# Altium footprint library MH_DA_THU_VIEN_16122016.PcbLib: 531 footprints (part 27 of 34)
Each footprint in its own frame and in the unit in brackets; x right, y up, seen from the top. Pads: shape width x height; smd on the part's side, far side on the other; paste and mask are expansions set on the pad; w line width, h text height; cw(c..) or ccw(c..) is an arc to the next point about the centre after c.
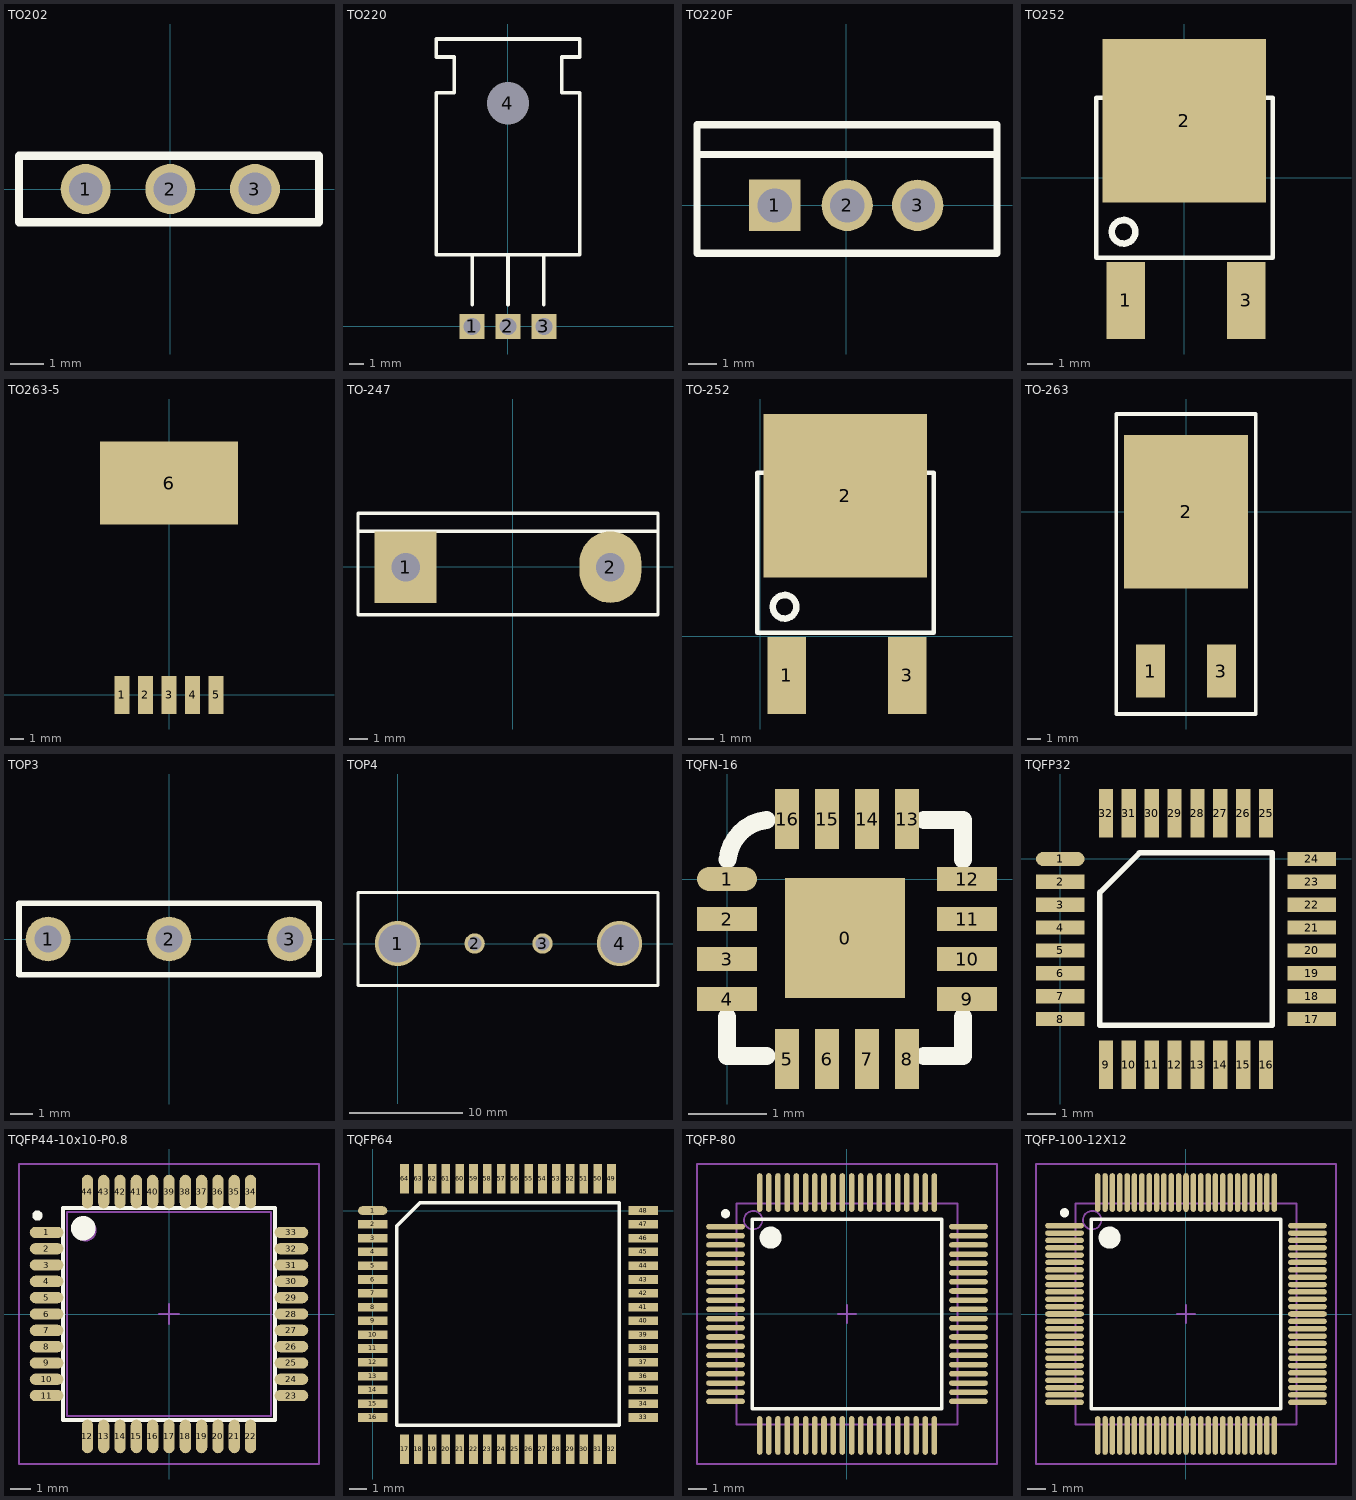
[diagram p26: the footprints below, top view; thin cyan lines are the x and y axes]

## TO202 [mm]
pads (3):
  round 1.5 hole 1: 1(-2.54,0) 2(0,0) 3(2.54,0)
Top Overlay:
  lines w0.254: -4.54,-1 -4.54,1 -3.54,1 3.46,1 4.46,1 4.46,-1 -3.54,-1 -4.54,-1

## TO220 [mil]
pads (4):
  rect 70x70 hole 47.24 unplated: 1(-100,0) 2(0,0) 3(100,0)
  round 70 hole 118.11 unplated: 4(0,621.26)
Top Overlay:
  lines w10: -100,60 -100,200 ; 0,60 0,200 ; 100,60 100,200 ; -200,200 -200,650 -150,650 -150,750 -200,750 -200,800 200,800 200,750 150,750 150,650 200,650 200,200 -200,200
3D body: height 762.4, standoff -532.48, extent -211.81,-39.37 188.19,126.19

## TO220F [mm]
pads (3):
  rect 1.8x1.8 hole 1.2: 1(-2.502,0)
  round 1.8 hole 1.2: 2(0.038,0) 3(2.502,0)
Top Overlay:
  lines w0.254: -5.22,1.778 5.279,1.778 5.279,1.753 ; -5.221,-1.676 -5.221,2.824 5.279,2.824 5.279,-1.676 -5.221,-1.676
3D body: height 19.37, standoff -9.48, extent -5.058,-1.88 5.083,2.82

## TO252 [mil]
pads (3):
  rect 59.06x118.11 smd: 1(-90,-188) 3(95,-188)
  rect 250x250 smd: 2(0,87)
Top Overlay:
  circle w10: c-93.03,-83 r18.03
  lines w7: -135,-123 -135,122 135,122 135,-123 -110,-123 -135,-123
3D body: height 91.15, standoff 0.6, extent -129.53,-213.48 129.52,168.41

## TO263-5 [mm] "LM2576-SMD"
pads (6):
  rect 1.07x2.75 smd: 1(-3.4,-0.025) 2(-1.7,-0.025) 3(0,-0.025) 4(1.7,-0.025) 5(3.4,-0.025)
  rect 10x6 smd: 6(0,15.289)
3D body: height 4.79, standoff -0.01, extent -5,-0.381 5,15.289

## TO-247 [mil]
pads (2):
  rect 130x150 hole 60: 1(-224.61,-0.91)
  oval 130x150 hole 60: 2(205.39,-0.91)
Top Overlay:
  lines w7: -324.61,74.09 304.39,74.09 ; -324.61,-100.91 305.39,-100.91 305.39,112.09 -324.61,112.09 -324.61,-100.91
3D body: height 826.77, standoff -790.16, extent -323.98,-103.03 303.98,95

## TO-252 [mil] "TO-252"
pads (3):
  rect 59.06x118.11 smd: 1(40,-60) 3(225,-60)
  rect 250x250 smd: 2(130,215)
Top Overlay:
  circle w10: c36.97,45 r18.03
  lines w7: -5,5 -5,250 265,250 265,5 20,5 -5,5
3D body: height 91.15, standoff 0.6, extent 0.47,-85.48 259.52,296.41

## TO-263 [mm]
pads (3):
  rect 2.1x3.8 smd: 1(-2.54,-11.425) 3(2.54,-11.425)
  rect 8.9x11 smd: 2(0,0)
Top Overlay:
  lines w0.254: -5,-14.5 5,-14.5 5,7 -5,7 -5,-14.5
3D body: height 4.88, standoff -0.13, extent -5.16,-11.132 5,4.132

## TOP3 [mm]
pads (3):
  round 2 hole 1.2: 1(-5.4,0) 2(0,0) 3(5.4,0)
Top Overlay:
  lines w0.254: -6.7,-1.6 6.7,-1.6 6.7,1.6 -6.7,1.6 -6.7,-1.6
3D body: height 13, standoff -22.9, extent -7.75,-3.2 7.75,1.3

## TOP4 [mm]
pads (4):
  round 4 hole 3.35: 1(0,0)
  round 1.8 hole 1.2: 2(6.8,0) 3(12.8,0)
  round 4 hole 3.4: 4(19.6,0)
Top Overlay:
  lines w0.254: -3.5,-3.7 -3.5,4.5 23,4.5 23,-3.7 -3.5,-3.7

## TQFN-16 [mil]
pads (17):
  rect 60x60 all layers, no hole: 0(59.06,-29.53)
  oval 30x12 smd: 1(0,0)
  rect 30x12 smd: 2(0,-20) 3(0,-40) 4(0,-60) 9(120,-60) 10(120,-40) 11(120,-20) 12(120,0)
  rect 12x30 smd: 5(30,-90) 6(50,-90) 7(70,-90) 8(90,-90) 13(90,30) 14(70,30) 15(50,30) 16(30,30)
Top Overlay:
  lines w9: 0,-68.9 0,-88.59 19.69,-88.59 ; 0.36,9.81 cw(c22.27,7.67) 19.69,29.53 ; 98.43,-88.59 118.12,-88.59 118.12,-68.9 ; 98.43,29.53 118.12,29.53 118.12,9.84

## TQFP32 [mm]
pads (32):
  oval 1.7x0.5 smd: 1(0,0)
  rect 1.7x0.5 smd: 2(0,-0.8) 3(0,-1.6) 4(0,-2.4) 5(0,-3.2) 6(0,-4) 7(0,-4.8) 8(0,-5.6) 17(8.8,-5.6) 18(8.8,-4.8) 19(8.8,-4) 20(8.8,-3.2) 21(8.8,-2.4) 22(8.8,-1.6) 23(8.8,-0.8) 24(8.8,0)
  rect 0.5x1.7 smd: 9(1.6,-7.2) 10(2.4,-7.2) 11(3.2,-7.2) 12(4,-7.2) 13(4.8,-7.2) 14(5.6,-7.2) 15(6.4,-7.2) 16(7.2,-7.2) 25(7.2,1.6) 26(6.4,1.6) 27(5.6,1.6) 28(4.8,1.6) 29(4,1.6) 30(3.2,1.6) 31(2.4,1.6) 32(1.6,1.6)
Top Overlay:
  lines w0.2: 1.385,-5.815 1.385,-1.17 2.77,0.215 7.415,0.215 7.415,-5.815 1.385,-5.815

## TQFP44-10x10-P0.8 [mm] "QFP, 44-Leads, Body 10x10mm, Pitch 0.8mm, IPC High Density"
height 2.44
pads (44):
  oval 1.65x0.55 smd: 1(-6,4) 2(-6,3.2) 3(-6,2.4) 4(-6,1.6) 5(-6,0.8) 6(-6,0) 7(-6,-0.8) 8(-6,-1.6) 9(-6,-2.4) 10(-6,-3.2) 11(-6,-4) 23(6,-4) 24(6,-3.2) 25(6,-2.4) 26(6,-1.6) 27(6,-0.8) 28(6,0) 29(6,0.8) 30(6,1.6) 31(6,2.4) 32(6,3.2) 33(6,4)
  oval 0.55x1.65 smd: 12(-4,-6) 13(-3.2,-6) 14(-2.4,-6) 15(-1.6,-6) 16(-0.8,-6) 17(0,-6) 18(0.8,-6) 19(1.6,-6) 20(2.4,-6) 21(3.2,-6) 22(4,-6) 34(4,6) 35(3.2,6) 36(2.4,6) 37(1.6,6) 38(0.8,6) 39(0,6) 40(-0.8,6) 41(-1.6,6) 42(-2.4,6) 43(-3.2,6) 44(-4,6)
Top Overlay:
  circle w0.6: c-4.2,4.2 r0.3
  circle w0.25: c-6.45,4.825 r0.125
  lines w0.2: -5.2,-5.2 5.2,-5.2 5.2,5.2 -5.2,5.2 -5.2,-5.2
Mechanical 13:
  circle w0.1: c-4.1,4.1 r0.5
  lines w0.1: -5,-5 5,-5 5,5 -5,5 -5,-5
Mechanical 15:
  lines w0.1: -0.5,0 0.5,0 ; 0,-0.5 0,0.5 ; -7.35,-7.35 7.35,-7.35 7.35,7.35 -7.35,7.35 -7.35,-7.35
3D body: height 1.07, standoff 0, extent -5.994,-5.994 6.006,6.006

## TQFP64 [mm]
pads (64):
  oval 1.7x0.5 smd: 1(0,0)
  rect 1.7x0.5 smd: 2(0,-0.8) 3(0,-1.6) 4(0,-2.4) 5(0,-3.2) 6(0,-4) 7(0,-4.8) 8(0,-5.6) 9(0,-6.4) 10(0,-7.2) 11(0,-8) 12(0,-8.8) 13(0,-9.6) 14(0,-10.4) 15(0,-11.2) 16(0,-12) 33(15.7,-12) 34(15.7,-11.2) 35(15.7,-10.4) 36(15.7,-9.6) 37(15.7,-8.8) 38(15.7,-8) 39(15.7,-7.2) 40(15.7,-6.4) 41(15.7,-5.6) 42(15.7,-4.8) 43(15.7,-4) 44(15.7,-3.2) 45(15.7,-2.4) 46(15.7,-1.6) 47(15.7,-0.8) 48(15.7,0)
  rect 0.5x1.7 smd: 17(1.85,-13.85) 18(2.65,-13.85) 19(3.45,-13.85) 20(4.25,-13.85) 21(5.05,-13.85) 22(5.85,-13.85) 23(6.65,-13.85) 24(7.45,-13.85) 25(8.25,-13.85) 26(9.05,-13.85) 27(9.85,-13.85) 28(10.65,-13.85) 29(11.45,-13.85) 30(12.25,-13.85) 31(13.05,-13.85) 32(13.85,-13.85) 49(13.85,1.85) 50(13.05,1.85) 51(12.25,1.85) 52(11.45,1.85) 53(10.65,1.85) 54(9.85,1.85) 55(9.05,1.85) 56(8.25,1.85) 57(7.45,1.85) 58(6.65,1.85) 59(5.85,1.85) 60(5.05,1.85) 61(4.25,1.85) 62(3.45,1.85) 63(2.65,1.85) 64(1.85,1.85)
Top Overlay:
  lines w0.2: 1.385,-12.465 1.385,-0.92 2.77,0.465 14.315,0.465 14.315,-12.465 1.385,-12.465
3D body: height 1.2, standoff 0, extent 0.508,-13.366 15.144,1.778

## TQFP-80 [mm] "Thin QFP, 80-Leads, Body 12x12mm, Pitch 0.5mm, IPC Low Density"
height 1.2
pads (80):
  oval 2.1x0.3 smd: 1(-6.6,4.75) 2(-6.6,4.25) 3(-6.6,3.75) 4(-6.6,3.25) 5(-6.6,2.75) 6(-6.6,2.25) 7(-6.6,1.75) 8(-6.6,1.25) 9(-6.6,0.75) 10(-6.6,0.25) 11(-6.6,-0.25) 12(-6.6,-0.75) 13(-6.6,-1.25) 14(-6.6,-1.75) 15(-6.6,-2.25) 16(-6.6,-2.75) 17(-6.6,-3.25) 18(-6.6,-3.75) 19(-6.6,-4.25) 20(-6.6,-4.75) 41(6.6,-4.75) 42(6.6,-4.25) 43(6.6,-3.75) 44(6.6,-3.25) 45(6.6,-2.75) 46(6.6,-2.25) 47(6.6,-1.75) 48(6.6,-1.25) 49(6.6,-0.75) 50(6.6,-0.25) 51(6.6,0.25) 52(6.6,0.75) 53(6.6,1.25) 54(6.6,1.75) 55(6.6,2.25) 56(6.6,2.75) 57(6.6,3.25) 58(6.6,3.75) 59(6.6,4.25) 60(6.6,4.75)
  oval 0.3x2.1 smd: 21(-4.75,-6.6) 22(-4.25,-6.6) 23(-3.75,-6.6) 24(-3.25,-6.6) 25(-2.75,-6.6) 26(-2.25,-6.6) 27(-1.75,-6.6) 28(-1.25,-6.6) 29(-0.75,-6.6) 30(-0.25,-6.6) 31(0.25,-6.6) 32(0.75,-6.6) 33(1.25,-6.6) 34(1.75,-6.6) 35(2.25,-6.6) 36(2.75,-6.6) 37(3.25,-6.6) 38(3.75,-6.6) 39(4.25,-6.6) 40(4.75,-6.6) 61(4.75,6.6) 62(4.25,6.6) 63(3.75,6.6) 64(3.25,6.6) 65(2.75,6.6) 66(2.25,6.6) 67(1.75,6.6) 68(1.25,6.6) 69(0.75,6.6) 70(0.25,6.6) 71(-0.25,6.6) 72(-0.75,6.6) 73(-1.25,6.6) 74(-1.75,6.6) 75(-2.25,6.6) 76(-2.75,6.6) 77(-3.25,6.6) 78(-3.75,6.6) 79(-4.25,6.6) 80(-4.75,6.6)
Top Overlay:
  circle w0.6: c-4.15,4.15 r0.3
  circle w0.25: c-6.6,5.45 r0.125
  lines w0.2: -5.15,-5.15 5.15,-5.15 5.15,5.15 -5.15,5.15 -5.15,-5.15
Mechanical 13:
  circle w0.1: c-5.1,5.1 r0.5
  lines w0.1: -6,-6 6,-6 6,6 -6,6 -6,-6
Mechanical 15:
  lines w0.1: -0.5,0 0.5,0 ; 0,-0.5 0,0.5 ; -8.15,-8.15 8.15,-8.15 8.15,8.15 -8.15,8.15 -8.15,-8.15
3D body: height 1.2, standoff 0, extent -6,-6 6,6

## TQFP-100-12X12 [mm] "Shrink QFP, 100-Leads, Body 12x12mm, Pitch 0.4mm, IPC High Density"
height 2.2
pads (100):
  oval 2.1x0.3 smd: 1(-6.6,4.8) 2(-6.6,4.4) 3(-6.6,4) 4(-6.6,3.6) 5(-6.6,3.2) 6(-6.6,2.8) 7(-6.6,2.4) 8(-6.6,2) 9(-6.6,1.6) 10(-6.6,1.2) 11(-6.6,0.8) 12(-6.6,0.4) 13(-6.6,0) 14(-6.6,-0.4) 15(-6.6,-0.8) 16(-6.6,-1.2) 17(-6.6,-1.6) 18(-6.6,-2) 19(-6.6,-2.4) 20(-6.6,-2.8) 21(-6.6,-3.2) 22(-6.6,-3.6) 23(-6.6,-4) 24(-6.6,-4.4) 25(-6.6,-4.8) 51(6.6,-4.8) 52(6.6,-4.4) 53(6.6,-4) 54(6.6,-3.6) 55(6.6,-3.2) 56(6.6,-2.8) 57(6.6,-2.4) 58(6.6,-2) 59(6.6,-1.6) 60(6.6,-1.2) 61(6.6,-0.8) 62(6.6,-0.4) 63(6.6,0) 64(6.6,0.4) 65(6.6,0.8) 66(6.6,1.2) 67(6.6,1.6) 68(6.6,2) 69(6.6,2.4) 70(6.6,2.8) 71(6.6,3.2) 72(6.6,3.6) 73(6.6,4) 74(6.6,4.4) 75(6.6,4.8)
  oval 0.3x2.1 smd: 26(-4.8,-6.6) 27(-4.4,-6.6) 28(-4,-6.6) 29(-3.6,-6.6) 30(-3.2,-6.6) 31(-2.8,-6.6) 32(-2.4,-6.6) 33(-2,-6.6) 34(-1.6,-6.6) 35(-1.2,-6.6) 36(-0.8,-6.6) 37(-0.4,-6.6) 38(0,-6.6) 39(0.4,-6.6) 40(0.8,-6.6) 41(1.2,-6.6) 42(1.6,-6.6) 43(2,-6.6) 44(2.4,-6.6) 45(2.8,-6.6) 46(3.2,-6.6) 47(3.6,-6.6) 48(4,-6.6) 49(4.4,-6.6) 50(4.8,-6.6) 76(4.8,6.6) 77(4.4,6.6) 78(4,6.6) 79(3.6,6.6) 80(3.2,6.6) 81(2.8,6.6) 82(2.4,6.6) 83(2,6.6) 84(1.6,6.6) 85(1.2,6.6) 86(0.8,6.6) 87(0.4,6.6) 88(0,6.6) 89(-0.4,6.6) 90(-0.8,6.6) 91(-1.2,6.6) 92(-1.6,6.6) 93(-2,6.6) 94(-2.4,6.6) 95(-2.8,6.6) 96(-3.2,6.6) 97(-3.6,6.6) 98(-4,6.6) 99(-4.4,6.6) 100(-4.8,6.6)
Top Overlay:
  circle w0.25: c-6.6,5.5 r0.125
  circle w0.6: c-4.15,4.15 r0.3
  lines w0.2: -5.15,-5.15 -5.15,5.15 5.15,5.15 5.15,-5.15 -5.15,-5.15
Mechanical 13:
  circle w0.1: c-5.1,5.1 r0.5
  lines w0.1: -6,-6 -6,6 6,6 6,-6 -6,-6
Mechanical 15:
  lines w0.1: -0.5,0 0.5,0 ; 0,-0.5 0,0.5 ; -8.15,-8.15 -8.15,8.15 8.15,8.15 8.15,-8.15 -8.15,-8.15
3D body: height 2.2, standoff 0, extent -6,-6 6,6